# Altium footprint library ConvertionBoard.PcbLib: 30 footprints (part 2 of 2)
Each footprint in its own frame and in the unit in brackets; x right, y up, seen from the top. Pads: shape width x height; smd on the part's side, far side on the other; paste and mask are expansions set on the pad; w line width, h text height; cw(c..) or ccw(c..) is an arc to the next point about the centre after c.
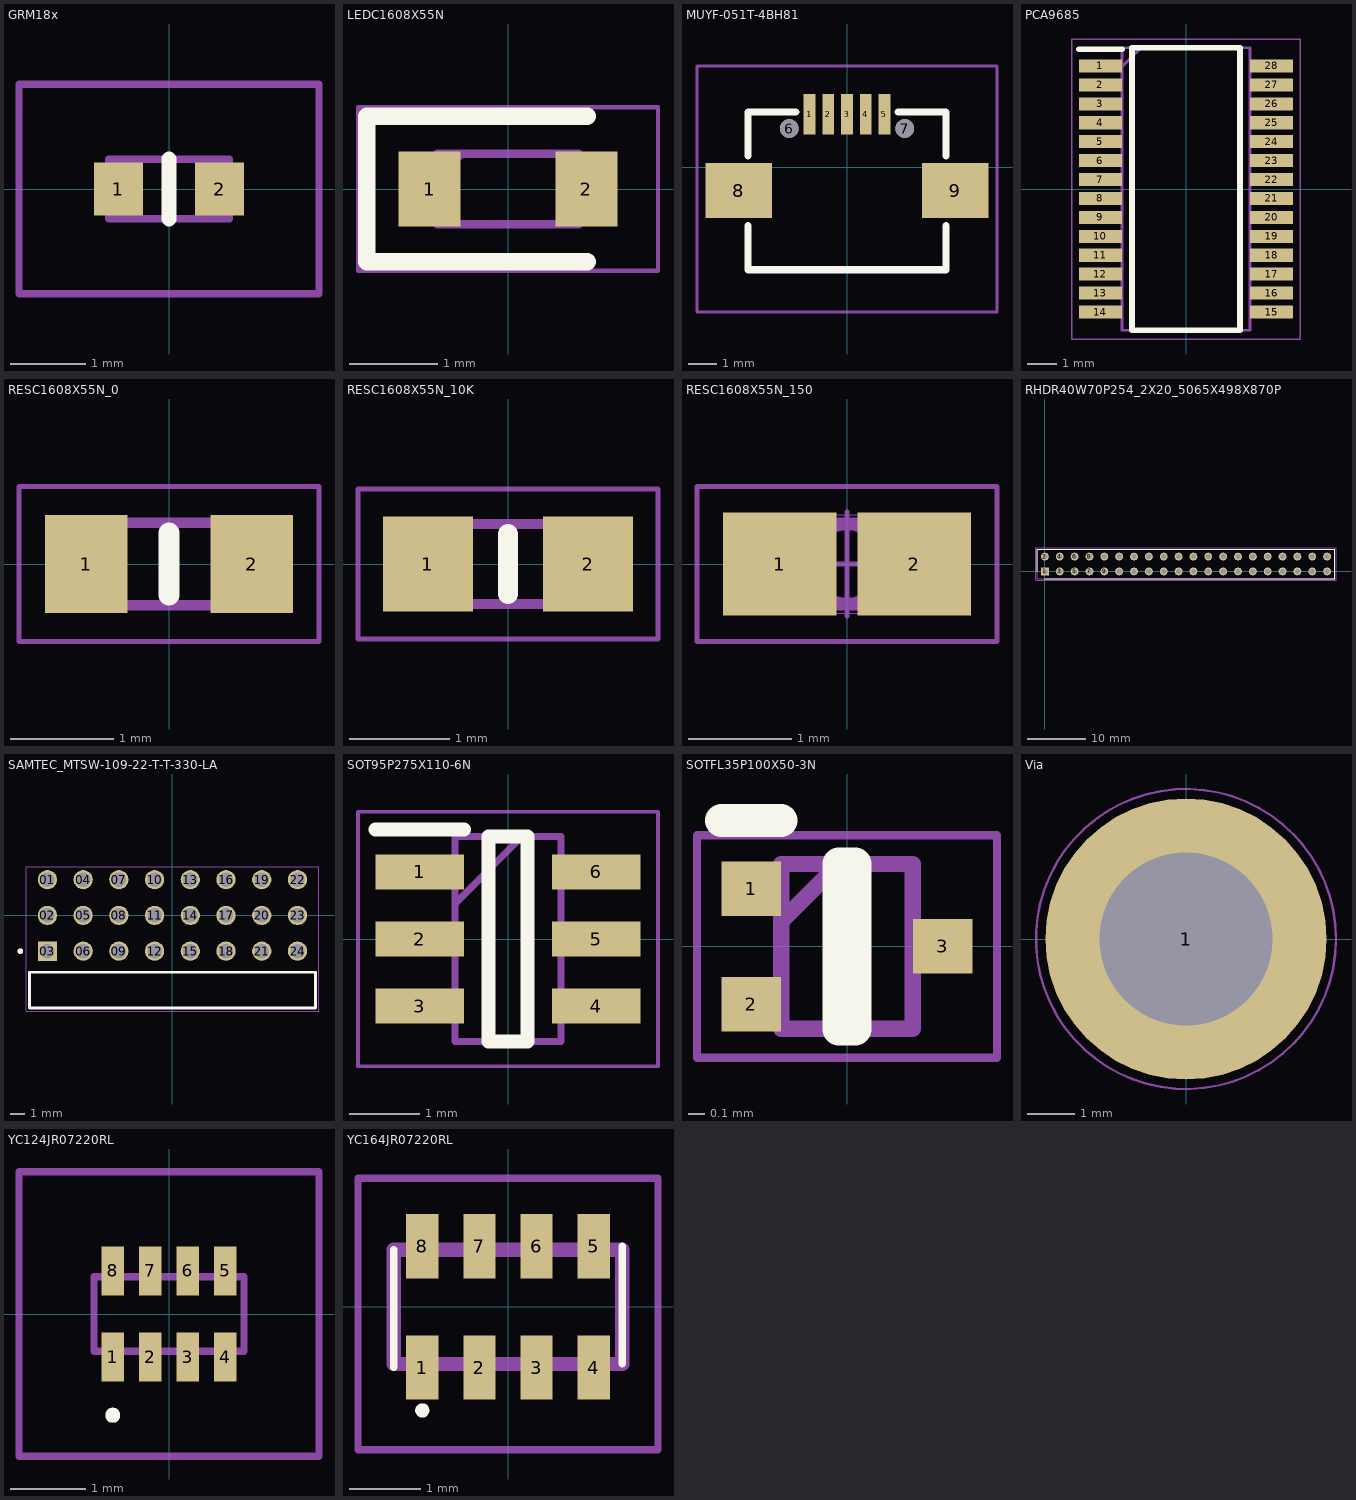
[diagram p1: the footprints below, top view; thin cyan lines are the x and y axes]

## GRM18x [mm]
pads (2):
  rect 0.65x0.7 smd: 1(-0.675,0) 2(0.675,0)
Top Overlay:
  lines w0.2: 0,-0.4 0,0.4
Mechanical 13:
  lines w0.1: -0.8,-0.4 0.8,-0.4 0.8,0.4 -0.8,0.4 -0.8,-0.4
Mechanical 15:
  lines w0.1: -2,-1.4 2,-1.4 2,1.4 -2,1.4 -2,-1.4
3D body "GRM188R61E106KA73D.stp": height 0.8, standoff 0, extent -0.8,-0.45 0.8,0.45

## LEDC1608X55N [mm]
pads (2):
  rect 0.7x0.85 smd: 1(-0.889,0) 2(0.889,0)
Top Overlay:
  lines w0.2: 0.9,-0.825 -1.6,-0.825 -1.6,0.825 0.9,0.825
Mechanical 13:
  lines w0.1: -0.8,0.133 -0.533,0.4 ; -0.8,-0.4 0.8,-0.4 0.8,0.4 -0.8,0.4 -0.8,-0.4
Mechanical 15:
  lines w0.05: -1.7,-0.925 1.7,-0.925 1.7,0.925 -1.7,0.925 -1.7,-0.925
3D body "SML-D12Y1WT86.stp": height 0.55, standoff 0, extent -0.8,-0.4 0.8,0.4

## MUYF-051T-4BH81 [mm]
pads (9):
  rect 0.4x1.4 smd: 1(-1.3,1.834) 2(-0.65,1.834) 3(0,1.834) 4(0.65,1.834) 5(1.3,1.834)
  round 0.65 hole 0.65: 6(-2,1.334) 7(2,1.334)
  rect 2.3x1.9 smd: 8(-3.75,-0.818) 9(3.75,-0.818)
Top Overlay:
  lines w0.254: -3.429,-2.032 -3.429,-3.556 3.429,-3.556 3.429,-2.032 ; -3.429,0.381 -3.429,1.905 -1.778,1.905 ; 1.778,1.905 3.429,1.905 3.429,0.381
Mechanical 15:
  lines w0.1: -5.2,-5.027 5.2,-5.027 5.2,3.503 -5.2,3.503 -5.2,-5.027
3D body "47346-0001.stp": height 2.72, standoff -0.22, extent -3.863,-3.514 4.117,1.916

## PCA9685 [mm]
pads (28):
  rect 1.475x0.45 smd: 1(-2.938,4.225) 2(-2.938,3.575) 3(-2.938,2.925) 4(-2.938,2.275) 5(-2.938,1.625) 6(-2.938,0.975) 7(-2.938,0.325) 8(-2.938,-0.325) 9(-2.938,-0.975) 10(-2.938,-1.625) 11(-2.938,-2.275) 12(-2.938,-2.925) 13(-2.938,-3.575) 14(-2.938,-4.225) 15(2.938,-4.225) 16(2.938,-3.575) 17(2.938,-2.925) 18(2.938,-2.275) 19(2.938,-1.625) 20(2.938,-0.975) 21(2.938,-0.325) 22(2.938,0.325) 23(2.938,0.975) 24(2.938,1.625) 25(2.938,2.275) 26(2.938,2.925) 27(2.938,3.575) 28(2.938,4.225)
Top Overlay:
  lines w0.2: -3.675,4.8 -2.2,4.8 ; -1.85,-4.85 1.85,-4.85 1.85,4.85 -1.85,4.85 -1.85,-4.85
Mechanical 15:
  lines w0.1: -2.2,4.2 -1.55,4.85 ; -2.2,-4.85 2.2,-4.85 2.2,4.85 -2.2,4.85 -2.2,-4.85
Mechanical 20:
  lines w0.05: -3.925,-5.15 3.925,-5.15 3.925,5.15 -3.925,5.15 -3.925,-5.15

## RESC1608X55N_0 [mm]
pads (2):
  rect 0.8x0.95 smd: 1(-0.8,0) 2(0.8,0)
Top Overlay:
  lines w0.2: 0,-0.3 0,0.3
Mechanical 13:
  lines w0.1: -0.8,-0.4 -0.8,0.4 0.8,0.4 0.8,-0.4 -0.8,-0.4
Mechanical 15:
  lines w0.05: -1.45,-0.75 -1.45,0.75 1.45,0.75 1.45,-0.75 -1.45,-0.75
3D body "RC0603JR-070RL.stp": height 0.55, standoff 0, extent -0.8,-0.4 0.8,0.4

## RESC1608X55N_10K [mm]
pads (2):
  rect 0.9x0.95 smd: 1(-0.8,0) 2(0.8,0)
Top Overlay:
  lines w0.2: 0,-0.3 0,0.3
Mechanical 13:
  lines w0.1: -0.8,-0.4 -0.8,0.4 0.8,0.4 0.8,-0.4 -0.8,-0.4
Mechanical 15:
  lines w0.05: -1.5,-0.75 -1.5,0.75 1.5,0.75 1.5,-0.75 -1.5,-0.75
3D body "0603WAJ0103T5E.stp": height 0.55, standoff 0, extent -0.8,-0.4 0.8,0.4

## RESC1608X55N_150 [mm]
pads (2):
  rect 1.1x1 smd: 1(-0.65,0) 2(0.65,0)
Mechanical 13:
  lines w0.1: -0.8,-0.4 -0.8,0.4 0.8,0.4 0.8,-0.4 -0.8,-0.4
Mechanical 15:
  circle w0.05: c0,0 r0.35
  lines w0.001: -0.85,-0.475 -0.85,0.475 0.85,0.475 0.85,-0.475 -0.85,-0.475
  lines w0.05: -0.5,0 0.5,0 ; 0,-0.5 0,0.5 ; -1.45,-0.75 -1.45,0.75 1.45,0.75 1.45,-0.75 -1.45,-0.75
3D body "RC0603FR-07150RL.stp": height 0.55, standoff 0, extent -0.8,-0.4 0.8,0.4

## RHDR40W70P254_2X20_5065X498X870P [mm]
pads (40):
  rect 1.35x1.35 / inner round 1.35 / far side rect 1.35x1.35 hole 0.9: 1(0,0)
  round 1.35 hole 0.9: 2(0,2.54) 3(2.54,0) 4(2.54,2.54) 5(5.08,0) 6(5.08,2.54) 7(7.62,0) 8(7.62,2.54) 9(10.16,0) 10(10.16,2.54) 11(12.7,0) 12(12.7,2.54) 13(15.24,0) 14(15.24,2.54) 15(17.78,0) 16(17.78,2.54) 17(20.32,0) 18(20.32,2.54) 19(22.86,0) 20(22.86,2.54) 21(25.4,0) 22(25.4,2.54) 23(27.94,0) 24(27.94,2.54) 25(30.48,0) 26(30.48,2.54) 27(33.02,0) 28(33.02,2.54) 29(35.56,0) 30(35.56,2.54) 31(38.1,0) 32(38.1,2.54) 33(40.64,0) 34(40.64,2.54) 35(43.18,0) 36(43.18,2.54) 37(45.72,0) 38(45.72,2.54) 39(48.26,0) 40(48.26,2.54)
Top Overlay:
  lines w0.2: -1.27,0 -1.27,3.81 49.53,3.81 49.53,-1.27 0,-1.27
Mechanical 15:
  lines w0.1: -1.27,-1.27 49.53,-1.27 49.53,3.81 -1.27,3.81 -1.27,-1.27
Mechanical 20:
  lines w0.05: -1.52,-1.52 49.78,-1.52 49.78,4.06 -1.52,4.06 -1.52,-1.52

## SAMTEC_MTSW-109-22-T-T-330-LA [mm]
pads (24):
  round 1.37 hole 1.02: 01(-8.89,2.54) 02(-8.89,0) 04(-6.35,2.54) 05(-6.35,0) 06(-6.35,-2.54) 07(-3.81,2.54) 08(-3.81,0) 09(-3.81,-2.54) 10(-1.27,2.54) 11(-1.27,0) 12(-1.27,-2.54) 13(1.27,2.54) 14(1.27,0) 15(1.27,-2.54) 16(3.81,2.54) 17(3.81,0) 18(3.81,-2.54) 19(6.35,2.54) 20(6.35,0) 21(6.35,-2.54) 22(8.89,2.54) 23(8.89,0) 24(8.89,-2.54)
  rect 1.37x1.37 / inner round 1.37 / far side rect 1.37x1.37 hole 1.02: 03(-8.89,-2.54)
Top Overlay:
  circle w0.2: c-10.81,-2.54 r0.1
  lines w0.2: -10.16,-6.58 10.16,-6.58 10.16,-4.04 -10.16,-4.04 -10.16,-6.58
Mechanical 13:
  circle w0.2: c-10.81,-2.54 r0.1
  lines w0.1: -10.16,-6.58 10.16,-6.58 10.16,-4.04 -10.16,-4.04 -10.16,-6.58
Mechanical 15:
  lines w0.05: 10.414,3.475 10.414,-6.83 -10.41,-6.83 -10.41,3.475 10.418,3.475
3D body "MTSW-108-22-T-T-330-LA.stp": height 1.8, standoff -8.61, extent -10.16,-15.049 10.16,2.794

## SOT95P275X110-6N [mm]
pads (6):
  rect 1.25x0.5 smd: 1(-1.25,0.95) 2(-1.25,0) 3(-1.25,-0.95) 4(1.25,-0.95) 5(1.25,0) 6(1.25,0.95)
Top Overlay:
  lines w0.2: -1.875,1.55 -0.625,1.55 ; -0.275,-1.45 -0.275,1.45 0.275,1.45 0.275,-1.45 -0.275,-1.45
Mechanical 13:
  lines w0.1: -0.75,0.5 0.2,1.45 ; -0.75,-1.45 -0.75,1.45 0.75,1.45 0.75,-1.45 -0.75,-1.45
Mechanical 15:
  lines w0.05: -2.125,-1.8 -2.125,1.8 2.125,1.8 2.125,-1.8 -2.125,-1.8
3D body "74HC2G34GV,125.stp": height 1.01, standoff 0, extent -1.377,-1.476 1.373,1.474

## SOTFL35P100X50-3N [mm]
pads (3):
  rect 0.36x0.33 smd: 1(-0.58,0.35) 2(-0.58,-0.35) 3(0.58,0)
Top Overlay:
  lines w0.2: -0.76,0.765 -0.4,0.765 ; -0.05,-0.5 -0.05,0.5 0.05,0.5 0.05,-0.5 -0.05,-0.5
Mechanical 13:
  lines w0.1: -0.4,0.15 -0.05,0.5 ; -0.4,-0.5 -0.4,0.5 0.4,0.5 0.4,-0.5 -0.4,-0.5
Mechanical 15:
  lines w0.05: -0.91,-0.675 -0.91,0.675 0.91,0.675 0.91,-0.675 -0.91,-0.675
3D body "TPD2EUSB30DRTR.stp": height 0.5, standoff 0, extent -0.5,-0.5 0.5,0.5

## Via [mm] "SMT Steel Spacer with internal Thread M2.5, height 1.5mm"
height 1.5
pads (1):
  round 6 / inner round 0 / far side round 0 hole 3.7 unplated: 1(0,0)
Top Paste:
  region: -2.902,0.325 -2.874,0.57 -2.738,1.044 -2.524,1.488 -2.239,1.89 -1.89,2.239 -1.488,2.524 -1.044,2.738 -0.57,2.874 -0.325,2.902 -0.325,1.872 -0.467,1.842 -0.743,1.749 -1.002,1.615 -1.237,1.443 -1.442,1.237 -1.614,1.002 -1.748,0.744 -1.842,0.468 -1.872,0.325
  region: -0.325,-2.902 -0.57,-2.874 -1.044,-2.738 -1.488,-2.524 -1.89,-2.239 -2.239,-1.89 -2.524,-1.488 -2.738,-1.044 -2.874,-0.57 -2.902,-0.325 -1.872,-0.325 -1.842,-0.467 -1.749,-0.743 -1.615,-1.002 -1.443,-1.237 -1.237,-1.442 -1.002,-1.614 -0.744,-1.748 -0.468,-1.842 -0.325,-1.872
  region: 2.902,-0.325 2.874,-0.57 2.738,-1.044 2.524,-1.488 2.239,-1.89 1.89,-2.239 1.488,-2.524 1.044,-2.738 0.57,-2.874 0.325,-2.902 0.325,-1.872 0.467,-1.842 0.743,-1.749 1.002,-1.615 1.237,-1.443 1.442,-1.237 1.614,-1.002 1.748,-0.744 1.842,-0.468 1.872,-0.325
  region: 0.325,2.902 0.57,2.874 1.044,2.738 1.488,2.524 1.89,2.239 2.239,1.89 2.524,1.488 2.738,1.044 2.874,0.57 2.902,0.325 1.872,0.325 1.842,0.467 1.749,0.743 1.615,1.002 1.443,1.237 1.237,1.442 1.002,1.614 0.744,1.748 0.468,1.842 0.325,1.872
Mechanical 11:
  circle w0.1: c0,0 r2.55
  text ".Designator" at -1.75,-0.75 h1.5
Mechanical 13:
  circle w0.1: c0,0 r2.55
Mechanical 15:
  circle w0.05: c0,0 r3.2
  lines w0.05: -0.5,0 0.5,0 ; 0,-0.5 0,0.5
3D body "9774015151.stp": height 1.5, standoff -1.4, extent -2.55,-2.547 2.55,2.547

## YC124JR07220RL [mm]
pads (8):
  rect 0.3x0.65 smd: 1(-0.75,-0.575) 2(-0.25,-0.575) 3(0.25,-0.575) 4(0.75,-0.575) 5(0.75,0.575) 6(0.25,0.575) 7(-0.25,0.575) 8(-0.75,0.575)
Top Overlay:
  lines w0.1: -0.75,-1.4 cw(c-0.75,-1.35) -0.75,-1.3 cw(c-0.75,-1.35) -0.75,-1.4
Mechanical 13:
  lines w0.1: -1,-0.5 -1,0.5 1,0.5 1,-0.5 -1,-0.5
Mechanical 15:
  lines w0.1: -2,-1.9 -2,1.9 2,1.9 2,-1.9 -2,-1.9
3D body "YC124-JR-07220RL.stp": height 0.38, standoff 0, extent -0.997,-0.5 1.003,0.5

## YC164JR07220RL [mm]
pads (8):
  rect 0.45x0.9 smd: 1(-1.2,-0.85) 2(-0.4,-0.85) 3(0.4,-0.85) 4(1.2,-0.85) 5(1.2,0.85) 6(0.4,0.85) 7(-0.4,0.85) 8(-1.2,0.85)
Top Overlay:
  lines w0.1: -1.6,-0.85 -1.6,0.8 ; 1.6,-0.8 1.6,0.85 ; -1.25,-1.45 ccw(c-1.2,-1.45) -1.15,-1.45 ccw(c-1.2,-1.45) -1.25,-1.45
Mechanical 13:
  lines w0.2: -1.6,-0.8 -1.6,0.8 1.6,0.8 1.6,-0.8 -1.6,-0.8
Mechanical 15:
  lines w0.1: -2.1,-2 -2.1,1.8 2.1,1.8 2.1,-2 -2.1,-2
3D body "YC164-JR-0710KL.stp": height 0.55, standoff 0, extent -1.6,-0.8 1.6,0.8